# Altium footprint library PCB元件库.PcbLib: 17 footprints (part 1 of 2)
Each footprint in its own frame and in the unit in brackets; x right, y up, seen from the top. Pads: shape width x height; smd on the part's side, far side on the other; paste and mask are expansions set on the pad; w line width, h text height; cw(c..) or ccw(c..) is an arc to the next point about the centre after c.
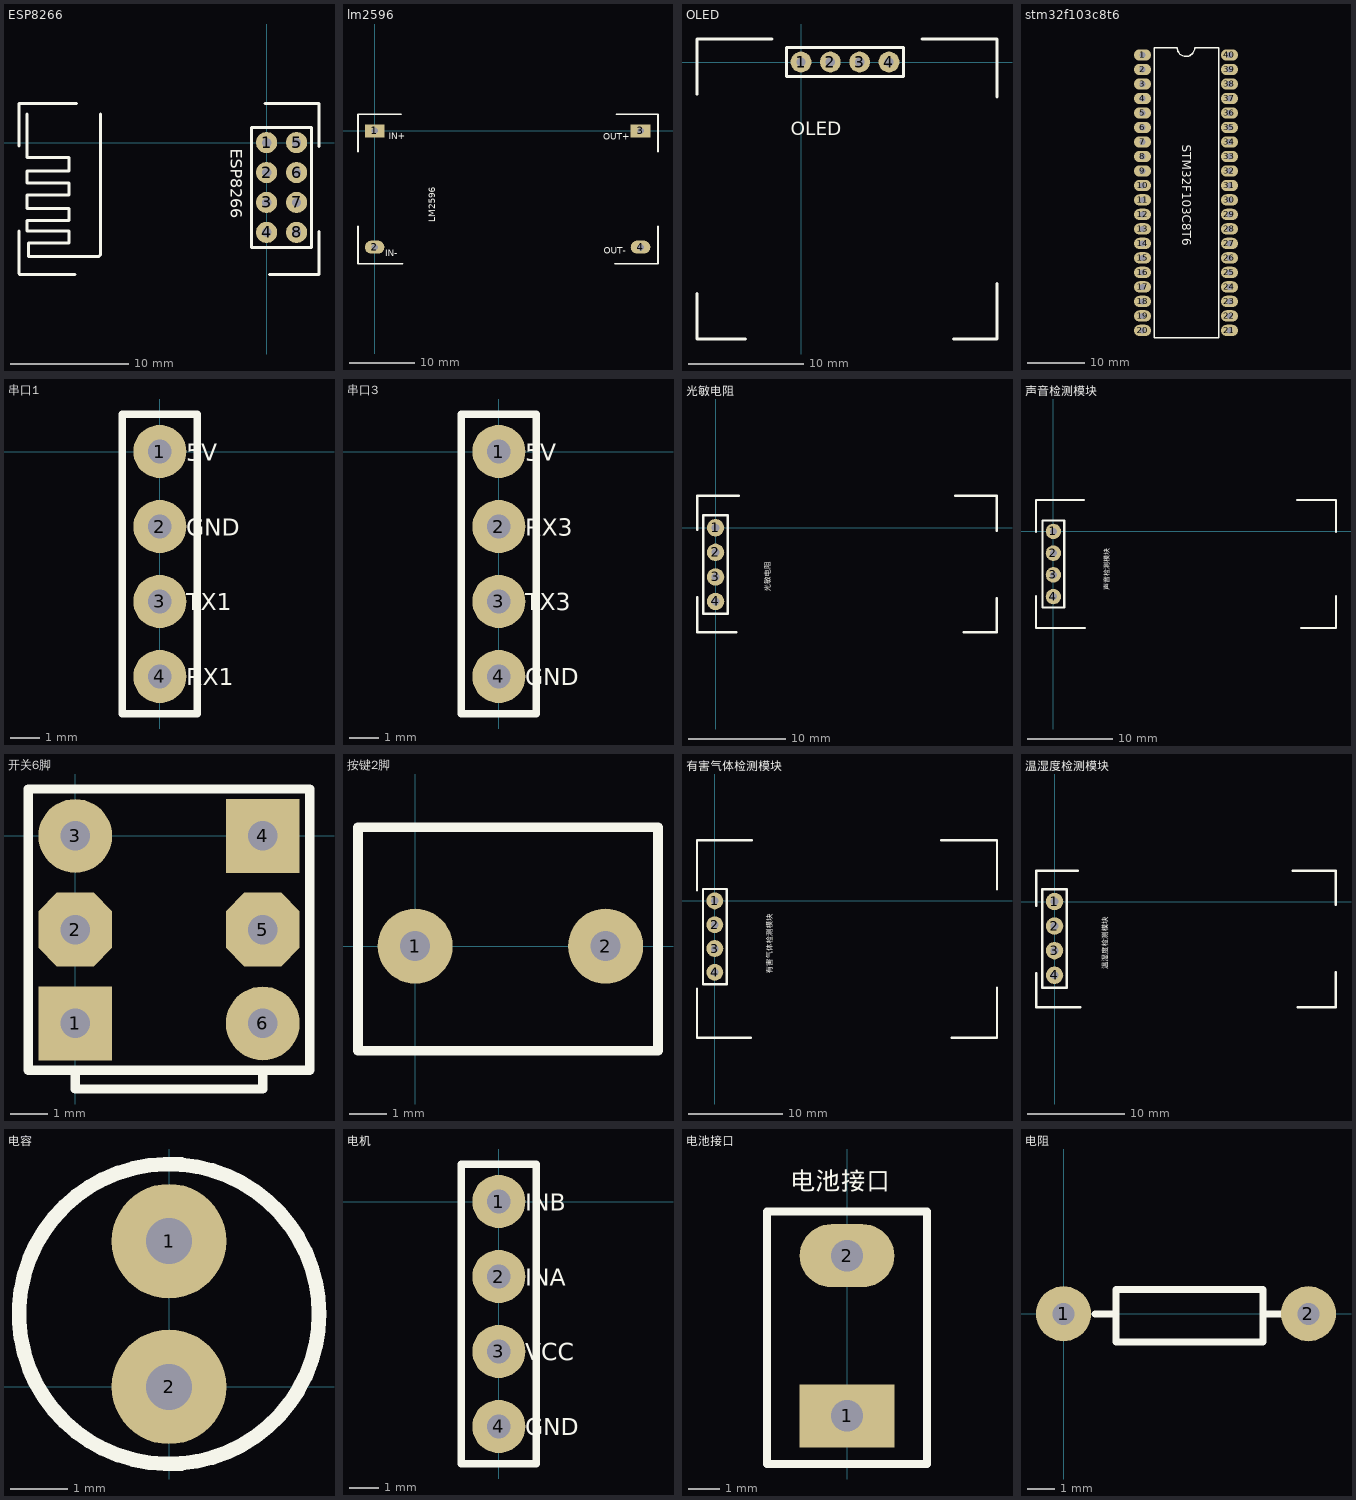
[diagram p0: the footprints below, top view; thin cyan lines are the x and y axes]

## ESP8266 [mm]
pads (8):
  round 1.8 hole 0.8: 1(0,0) 2(0,-2.54) 3(0,-5.08) 4(0,-7.62) 5(2.54,0) 6(2.54,-2.54) 7(2.54,-5.08) 8(2.54,-7.62)
Top Overlay:
  lines w0.254: -20.99,-11.097 -20.99,-7.497 ; -20.99,-0.297 -20.99,3.302 -16.129,3.302 ; -20.955,-11.176 -16.256,-11.176 ; -20.32,2.413 -20.32,-1.27 -16.764,-1.27 -16.764,-2.413 -20.32,-2.413 -20.32,-3.429 -16.764,-3.429 -16.764,-4.445 -20.32,-4.445 -20.32,-5.588 -16.764,-5.588 -16.764,-5.969 -16.764,-6.604 -20.32,-6.604 -20.32,-7.493 -16.764,-7.493 -16.764,-8.509 -20.193,-8.509 -20.193,-9.652 -14.224,-9.652 -14.097,-9.525 -14.097,-1.524 -14.097,2.413 ; -0.127,3.302 4.445,3.302 4.445,-0.318 ; 0.254,-11.176 4.445,-11.176 4.445,-7.556 ; -1.27,-8.89 -1.27,1.27 3.81,1.27 3.81,-8.89 -1.27,-8.89
  text "ESP8266" at -3.048,-0.508 h1

## lm2596 [mm]
pads (4):
  rect 3x2 hole 1: 1(0,0) 3(40.64,0)
  oval 3x2 hole 1: 2(0,-17.78) 4(40.64,-17.78)
Top Overlay:
  lines w0.254: -2.54,-14.605 -2.54,-20.32 4.318,-20.32 ; -2.54,-3.175 -2.54,2.54 4.064,2.54 ; 36.703,-20.32 43.307,-20.32 43.307,-14.605 ; 36.957,2.54 43.307,2.54 43.307,-3.175
  text "OUT-" at 35.052,-18.796 h1
  text "OUT+" at 34.925,-1.397 h1
  text "IN-" at 1.651,-19.177 h1
  text "IN+" at 2.159,-1.27 h1
  text "LM2596" at 9.271,-13.97 h1

## OLED [mm]
pads (4):
  round 1.8 hole 0.8: 1(0,0) 2(2.54,0) 3(5.08,0) 4(7.62,0)
Top Overlay:
  lines w0.254: -9.017,-20.066 -9.017,-24.003 -4.826,-24.003 ; -9.017,-2.794 -9.017,1.997 -2.517,1.997 ; 10.483,1.997 16.983,1.997 16.983,-3.048 ; 13.208,-24.003 16.983,-24.003 16.983,-19.177 ; -1.27,-1.27 -1.27,1.27 8.89,1.27 8.89,-1.27 -1.27,-1.27
  text "OLED" at -0.889,-6.731 h2

## stm32f103c8t6 [mm]
pads (40):
  oval 3x2 hole 1: 1(-571.5,-723.9) 2(-571.5,-726.44) 3(-571.5,-728.98) 4(-571.5,-731.52) 5(-571.5,-734.06) 6(-571.5,-736.6) 7(-571.5,-739.14) 8(-571.5,-741.68) 9(-571.5,-744.22) 10(-571.5,-746.76) 11(-571.5,-749.3) 12(-571.5,-751.84) 13(-571.5,-754.38) 14(-571.5,-756.92) 15(-571.5,-759.46) 16(-571.5,-762) 17(-571.5,-764.54) 18(-571.5,-767.08) 19(-571.5,-769.62) 20(-571.5,-772.16) 21(-556.26,-772.16) 22(-556.26,-769.62) 23(-556.26,-767.08) 24(-556.26,-764.54) 25(-556.26,-762) 26(-556.26,-759.46) 27(-556.26,-756.92) 28(-556.26,-754.38) 29(-556.26,-751.84) 30(-556.26,-749.3) 31(-556.26,-746.76) 32(-556.26,-744.22) 33(-556.26,-741.68) 34(-556.26,-739.14) 35(-556.26,-736.6) 36(-556.26,-734.06) 37(-556.26,-731.52) 38(-556.26,-728.98) 39(-556.26,-726.44) 40(-556.26,-723.9)
Top Overlay:
  lines w0.254: -565.409,-722.63 ccw(c-563.88,-722.63) -562.351,-722.675 ; -565.404,-722.63 -569.468,-722.63 -569.468,-773.43 -559.308,-773.43 ; -562.356,-722.63 -558.165,-722.63 -558.165,-773.43 -559.435,-773.43
  text "STM32F103C8T6" at -564.515,-739.648 h1.52

## 串口1 [mm]
pads (4):
  round 1.8 hole 0.8: 1(0,0) 2(0,-2.54) 3(0,-5.08) 4(0,-7.62)
Top Overlay:
  lines w0.254: -1.27,-8.89 -1.27,1.27 1.27,1.27 1.27,-8.89 -1.27,-8.89
  text "RX1" at 0.889,-8.128 h1
  text "TX1" at 0.889,-5.588 h1
  text "GND" at 0.889,-3.048 h1
  text "5V" at 0.889,-0.508 h1

## 串口3 [mm]
pads (4):
  round 1.8 hole 0.8: 1(0,0) 2(0,-2.54) 3(0,-5.08) 4(0,-7.62)
Top Overlay:
  lines w0.254: -1.27,-8.89 1.27,-8.89 1.27,1.27 -1.27,1.27 -1.27,-8.89
  text "5V" at 0.889,-0.508 h1
  text "RX3" at 0.889,-3.048 h1
  text "TX3" at 0.889,-5.588 h1
  text "GND" at 0.889,-8.128 h1

## 光敏电阻 [mm]
pads (4):
  round 1.8 hole 0.8: 1(0,0) 2(0,-2.54) 3(0,-5.08) 4(0,-7.62)
Top Overlay:
  lines w0.254: -1.917,-10.795 2.159,-10.795 ; -1.905,-10.698 -1.905,-7.198 ; -1.905,-0.198 -1.905,3.302 2.413,3.302 ; 24.765,3.302 29.095,3.302 ; 25.654,-10.795 29.083,-10.795 29.083,-7.295 ; 29.083,-0.295 29.083,3.205 ; -1.27,-8.89 -1.27,1.27 1.27,1.27 1.27,-8.89 -1.27,-8.89
  text "光敏电阻" at 5.842,-6.604 h1

## 声音检测模块 [mm]
pads (4):
  round 1.8 hole 0.8: 1(0,0) 2(0,-2.54) 3(0,-5.08) 4(0,-7.62)
Top Overlay:
  lines w0.254: -2.032,-7.556 -2.032,-11.303 3.683,-11.303 ; -2.032,-0.064 -2.032,3.683 3.556,3.683 ; 28.448,3.683 33.02,3.683 33.02,-0.064 ; 28.956,-11.303 33.02,-11.303 33.02,-7.556 ; -1.27,-8.89 1.27,-8.89 1.27,1.27 -1.27,1.27 -1.27,-8.89
  text "声音检测模块" at 6.731,-6.858 h1

## 开关6脚 [mm]
pads (6):
  rect 2x2 hole 0.8: 1(0,-5.08) 4(5.08,0)
  oct 2x2 hole 0.8: 2(0,-2.54) 5(5.08,-2.54)
  round 2 hole 0.8: 3(0,0) 6(5.08,-5.08)
Top Overlay:
  lines w0.254: 0,-6.35 0,-6.858 5.08,-6.858 5.08,-6.35 ; -1.27,-6.35 6.35,-6.35 6.35,1.016 6.35,1.27 -1.27,1.27 -1.27,-6.35

## 按键2脚 [mm]
pads (2):
  round 2 hole 0.8: 1(0,0) 2(5.08,0)
Top Overlay:
  lines w0.254: -1.524,-2.794 6.477,-2.794 6.477,3.175 -1.524,3.175 -1.524,2.667 -1.524,-2.794

## 有害气体检测模块 [mm]
pads (4):
  round 1.8 hole 0.8: 1(0,0) 2(0,-2.54) 3(0,-5.08) 4(0,-7.62)
Top Overlay:
  lines w0.254: -1.905,-9.355 -1.905,-14.605 3.81,-14.605 ; -1.905,1.145 -1.905,6.395 ; -1.901,6.477 3.937,6.477 ; 24.13,6.477 30.099,6.477 30.099,1.227 ; 25.273,-14.605 30.095,-14.605 ; 30.099,-14.523 30.099,-9.273 ; -1.27,-8.89 -1.27,1.27 1.27,1.27 1.27,-8.89 -1.27,-8.89
  text "有害气体检测模块" at 6.35,-7.747 h1

## 温湿度检测模块 [mm]
pads (4):
  round 1.8 hole 0.8: 1(0,0) 2(0,-2.54) 3(0,-5.08) 4(0,-7.62)
Top Overlay:
  lines w0.254: -1.917,3.175 2.413,3.175 ; -1.905,-7.422 -1.905,-10.922 2.667,-10.922 ; -1.905,-0.422 -1.905,3.078 ; 24.638,3.175 29.083,3.175 29.083,-0.325 ; 25.146,-10.922 29.095,-10.922 ; 29.083,-10.825 29.083,-7.325 ; -1.27,-8.89 -1.27,1.27 1.27,1.27 1.27,-8.89 -1.27,-8.89
  text "温湿度检测模块" at 5.715,-6.985 h1

## 电容 [mm]
pads (2):
  round 2 hole 0.8: 1(0,2.54) 2(0,0)
Top Overlay:
  circle w0.254: c0,1.27 r2.615

## 电机 [mm]
pads (4):
  round 1.8 hole 0.8: 1(0,0) 2(0,-2.54) 3(0,-5.08) 4(0,-7.62)
Top Overlay:
  lines w0.254: -1.27,-8.89 -1.27,1.27 1.27,1.27 1.27,-8.89 -1.27,-8.89
  text "GND" at 0.889,-8.128 h1
  text "VCC" at 0.889,-5.588 h1
  text "INA" at 0.889,-3.048 h1
  text "INB" at 0.889,-0.508 h1

## 电池接口 [mm]
pads (2):
  rect 3x2 hole 1: 1(0,5.08)
  oval 3x2 hole 1: 2(0,10.16)
Top Overlay:
  lines w0.254: -2.54,3.556 2.54,3.556 2.54,11.557 1.27,11.557 -1.27,11.557 -2.54,11.557 -2.54,3.556
  text "电池接口" at -1.778,12.065 h1

## 电阻 [mm]
pads (2):
  round 2 hole 0.8: 1(0,0) 2(8.89,0)
Top Overlay:
  lines w0.254: 1.27,0 1.143,0 1.778,0 ; 7.366,0 7.62,0 7.874,0 ; 1.905,-1.016 7.239,-1.016 7.239,0.889 1.905,0.889 1.905,0.127 1.905,-1.016